# Altium footprint library PCB_Connector.PcbLib: 65 footprints (part 1 of 5)
Each footprint in its own frame and in the unit in brackets; x right, y up, seen from the top. Pads: shape width x height; smd on the part's side, far side on the other; paste and mask are expansions set on the pad; w line width, h text height; cw(c..) or ccw(c..) is an arc to the next point about the centre after c.
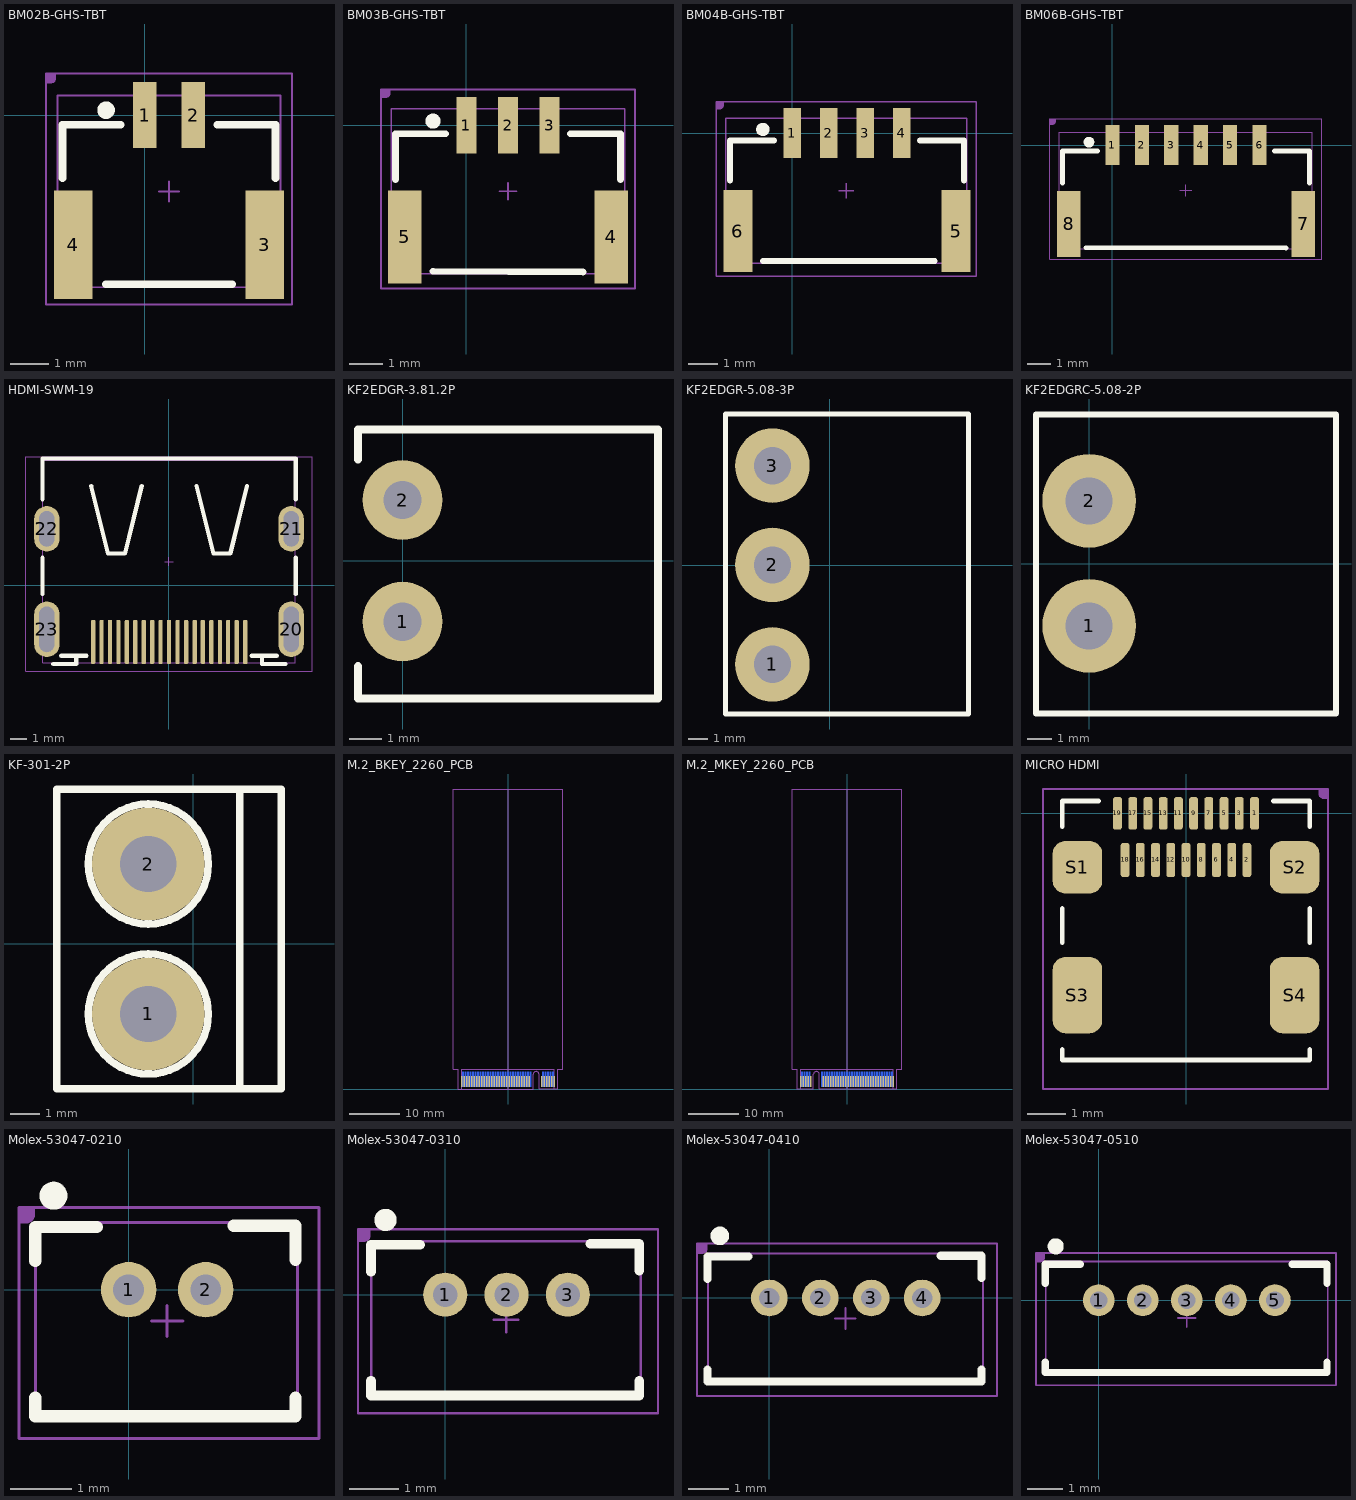
[diagram p0: the footprints below, top view; thin cyan lines are the x and y axes]

## BM02B-GHS-TBT [mm] "GH02立式"
height 4.05
pads (4):
  rect 0.6x1.7 smd: 1(0,0) 2(1.25,0)
  rect 1x2.8 smd: 3(3.1,-3.35) 4(-1.85,-3.35)
Top Overlay:
  circle w0.254: c-1,0.125 r0.1
  lines w0.2: -2.125,-1.625 -2.125,-0.25 -0.625,-0.25 ; -1,-4.375 2.25,-4.375 ; 1.875,-0.25 3.375,-0.25 3.375,-1.625
Top Assembly (Mech13):
  lines w0.051: -2.25,-1.975 -2.25,0.5 ; 0.371,-1.975 0.879,-1.975 ; 0.625,-2.229 0.625,-1.721 ; -2.25,0.5 -2.25,-4.45 3.5,-4.45 3.5,0.5 -2.25,0.5
Top Component:
  region: -2.55,1.073 -2.296,1.073 -2.296,0.946 -2.296,0.921 -2.315,0.874 -2.351,0.838 -2.398,0.819 -2.423,0.819 -2.55,0.819
  lines w0.051: -2.55,-4.896 3.8,-4.896 3.8,1.073 -2.55,1.073 -2.55,-4.896
  text ".Designator" at -0.645,-2.483 h2.03
3D body "BM02B-GHS-TBT.STEP": height 4.18, standoff -0.03, extent -2.25,-4.45 3.5,0.5

## BM03B-GHS-TBT [mm] "GH03立式"
height 4.05
pads (5):
  rect 0.6x1.7 smd: 1(0,0) 2(1.25,0) 3(2.5,0)
  rect 1x2.8 smd: 4(4.35,-3.35) 5(-1.85,-3.35)
Top Overlay:
  circle w0.254: c-1,0.125 r0.1
  lines w0.2: -2.125,-1.625 -2.125,-0.25 -0.625,-0.25 ; -1,-4.375 3.5,-4.4 ; 3.125,-0.25 4.625,-0.25 4.625,-1.625
Top Assembly (Mech13):
  lines w0.051: 0.996,-1.975 1.504,-1.975 ; 1.25,-2.229 1.25,-1.721 ; -2.25,-4.45 4.75,-4.45 4.75,0.5 -2.25,0.5 -2.25,-4.45
Top Component:
  region: -2.54,1.073 -2.286,1.073 -2.286,0.946 -2.286,0.921 -2.305,0.874 -2.341,0.838 -2.388,0.819 -2.413,0.819 -2.54,0.819
  lines w0.051: -2.56,-4.896 -2.56,1.073 5.06,1.073 5.06,-4.896 -2.56,-4.896
  text ".Designator" at -0.02,-2.483 h2.03
3D body "BM03B-GHS-TBT.STEP": height 4.18, standoff -0.03, extent -2.25,-4.45 4.75,0.5

## BM04B-GHS-TBT [mm] "GH04立式"
height 4.05
pads (6):
  rect 0.6x1.7 smd: 1(0,0) 2(1.25,0) 3(2.5,0) 4(3.75,0)
  rect 1x2.8 smd: 5(5.6,-3.35) 6(-1.85,-3.35)
Top Overlay:
  circle w0.254: c-1,0.125 r0.1
  lines w0.2: -2.125,-1.625 -2.125,-0.25 -0.625,-0.25 ; -1,-4.375 4.875,-4.375 ; 4.375,-0.25 5.875,-0.25 5.875,-1.625
Top Assembly (Mech13):
  lines w0.051: 1.596,-1.975 2.104,-1.975 ; 1.85,-2.229 1.85,-1.721 ; -2.275,-4.45 -2.275,0.5 5.975,0.5 5.975,-4.45 -2.275,-4.45
Top Component:
  region: -2.595,1.073 -2.341,1.073 -2.341,0.946 -2.341,0.921 -2.36,0.874 -2.396,0.838 -2.443,0.819 -2.468,0.819 -2.595,0.819
  lines w0.051: -2.595,-4.896 6.295,-4.896 6.295,1.073 -2.595,1.073 -2.595,-4.896
  text ".Designator" at 0.58,-2.483 h2.03
3D body "BM04B-GHS-TBT.STEP": height 4.18, standoff -0.03, extent -2.275,-4.45 5.975,0.5

## BM06B-GHS-TBT [mm] "GH06立式"
height 4.05
pads (8):
  rect 0.6x1.7 smd: 1(0,0) 2(1.25,0) 3(2.5,0) 4(3.75,0) 5(5,0) 6(6.25,0)
  rect 1x2.8 smd: 7(8.1,-3.35) 8(-1.85,-3.35)
Top Overlay:
  circle w0.254: c-1,0.125 r0.1
  lines w0.2: -2.125,-1.625 -2.125,-0.25 -0.625,-0.25 ; -1.132,-4.369 7.375,-4.375 ; 6.875,-0.25 8.375,-0.25 8.375,-1.625
Top Assembly (Mech13):
  lines w0.051: 2.865,-1.93 3.373,-1.93 ; 3.119,-2.184 3.119,-1.676 ; -2.256,-4.405 -2.256,0.545 8.494,0.545 8.494,-4.405 -2.256,-4.405
Top Component:
  region: -2.667,1.118 -2.413,1.118 -2.413,0.991 -2.413,0.965 -2.432,0.919 -2.468,0.883 -2.515,0.864 -2.54,0.864 -2.667,0.864
  lines w0.051: -2.667,-4.851 8.89,-4.851 8.89,1.118 -2.667,1.118 -2.667,-4.851
  text ".Designator" at 1.849,-2.438 h2.03
3D body "BM06B-GHS-TBT.STEP": height 4.18, standoff -0.03, extent -2.256,-4.405 8.494,0.545

## HDMI-SWM-19 [mm] "HDMI-SWM-19"
pads (23):
  rrect50% 0.254x2.6 smd: 1(-4.5,-3.355) 2(-4,-3.355) 3(-3.5,-3.355) 4(-3,-3.355) 5(-2.5,-3.355) 6(-2,-3.355) 7(-1.5,-3.355) 8(-1,-3.355) 9(-0.5,-3.355) 10(0,-3.355) 11(0.508,-3.355) 12(1.016,-3.355) 13(1.524,-3.355) 14(2.007,-3.355) 15(2.515,-3.355) 16(3.023,-3.355) 17(3.505,-3.355) 18(4.013,-3.355) 19(4.521,-3.355)
  oval 1.5x3.3 hole 2.7 slot 0.9 at 0 deg: 20(7.25,-2.605) 23(-7.25,-2.605)
  oval 1.5x2.7 hole 2.1 slot 0.9 at 0 deg: 21(7.25,3.355) 22(-7.25,3.355)
Top Overlay:
  lines w0.254: -7.5,-0.513 -7.5,1.637 ; -7.5,5.116 -7.5,7.529 7.518,7.529 7.518,5.116 ; -6.875,-4.667 -5.5,-4.667 -5.5,-4.167 ; -6.4,-4.167 -5.5,-4.167 ; -4.9,-4.167 -5.5,-4.167 ; -4.619,5.903 -3.619,1.89 -2.619,1.89 -1.619,5.903 ; 1.626,5.903 2.642,1.89 3.632,1.89 4.623,5.903 ; 4.902,-4.167 5.512,-4.167 ; 6.401,-4.167 5.512,-4.167 ; 6.909,-4.667 5.512,-4.667 5.512,-4.167 ; 7.518,-0.513 7.518,1.637
Top Assembly (Mech13):
  lines w0.051: -0.254,1.414 0.254,1.414 ; 0,1.16 0,1.668 ; -7.5,-4.586 7.5,-4.586 7.5,7.414 -7.5,7.414 -7.5,-4.586
Top Component:
  lines w0.051: -8.509,-5.08 -8.509,7.62 8.509,7.62 8.509,-5.08 -8.509,-5.08
  text ".Designator" at -1.274,0.87 h2.03
3D body "1.stp": height 6.14, standoff -2.14, extent -7.5,-4.586 7.5,7.414

## KF2EDGR-3.81.2P [mm]
pads (2):
  round 2.5 hole 1.2: 1(0,-1.905) 2(0,1.905)
Top Overlay:
  lines w0.254: -1.397,-3.302 -1.397,-4.318 8.001,-4.318 8.001,4.119 -1.397,4.119 -1.397,3.175 ; 0,1.143 0,1.524
3D body "KF2EDGR-3.81-2P.stp": height 7.1, standoff -3.17, extent -1.298,-4.191 7.902,4.119

## KF2EDGR-5.08-3P [mil]
pads (3):
  round 150 hole 75: 1(-115,-199) 2(-115,1) 3(-115,201)
Top Overlay:
  lines w10: -210,-299 -210,305 280,305 280,-299 -210,-299
3D body "User Library-MSTB 2,5-3-G-5,08 1759020.STEP": height 338.58, standoff -137.8, extent -195,-300 277.53,300

## KF2EDGRC-5.08-2P [mil]
pads (2):
  round 150 hole 75: 1(0,-99) 2(0,101)
Top Overlay:
  lines w10: -85,-239.37 395,-239.37 395,239.36 -85,239.36 -85,-239.37
3D body "14043.step": height 322.83, standoff -153.54, extent -80,-239.37 392.53,239.37

## KF-301-2P [mil]
pads (2):
  round 150 hole 75: 1(-60,-94) 2(-60,106)
Top Overlay:
  circle w10: c-60,106 r80
  circle w10: c-60,-94 r80
  lines w10: -60,-174 -60,-159 ; -60,-29 -60,-14 ; -60,26 -60,41 ; -60,171 -60,186 ; 62.05,-194 62.05,206 ; -182.05,-194 -182.05,206 117.17,206 117.17,-194 -182.05,-194
3D body "User Library-Terminal-Screw-3A-2way.SLDPRT": height 393.7, standoff -118.11, extent -181.61,-203.84 117.61,213.48

## M.2_BKEY_2260_PCB [mm]
pads (67):
  rect 0.35x2.2 smd: 1(9.25,1.5) 3(8.75,1.5) 5(8.25,1.5) 7(7.75,1.5) 9(7.25,1.5) 11(6.75,1.5) 13(4.25,1.5) 15(3.75,1.5) 17(3.25,1.5) 19(2.75,1.5) 21(2.25,1.5) 23(1.75,1.5) 25(1.25,1.5) 27(0.75,1.5) 29(0.25,1.5) 31(-0.25,1.5) 33(-0.75,1.5) 35(-1.25,1.5) 37(-1.75,1.5) 39(-2.25,1.5) 41(-2.75,1.5) 43(-3.25,1.5) 45(-3.75,1.5) 47(-4.25,1.5) 49(-4.75,1.5) 51(-5.25,1.5) 53(-5.75,1.5) 55(-6.25,1.5) 57(-6.75,1.5) 67(-7.25,1.5) 69(-7.75,1.5) 71(-8.25,1.5) 73(-8.75,1.5) 75(-9.25,1.5)
  rect 0.35x3 smd far side: 2(9,1.9) 4(8.5,1.9) 6(8,1.9) 8(7.5,1.9) 10(7,1.9) 12(4.5,1.9) 14(4,1.9) 16(3.5,1.9) 18(3,1.9) 20(2.5,1.9) 22(2,1.9) 24(1.5,1.9) 26(1,1.9) 28(0.5,1.9) 30(0,1.9) 32(-0.5,1.9) 34(-1,1.9) 36(-1.5,1.9) 38(-2,1.9) 40(-2.5,1.9) 42(-3,1.9) 44(-3.5,1.9) 46(-4,1.9) 48(-4.5,1.9) 50(-5,1.9) 52(-5.5,1.9) 54(-6,1.9) 56(-6.5,1.9) 58(-7,1.9) 68(-7.5,1.9) 70(-8,1.9) 72(-8.5,1.9) 74(-9,1.9)
Top Component:
  lines w0.051: -9.25,0 -9.25,4 9.25,4 9.25,0 ; 0,0 0,60 ; -11,4 -11,60 11,60 11,4 9.925,4 9.925,0 6.225,0 6.225,2.9 ccw(c5.625,2.9) 5.625,3.5 ccw(c5.625,2.9) 5.025,2.9 5.025,0 -9.925,0 -9.925,4 -11,4

## M.2_MKEY_2260_PCB [mm]
pads (67):
  rect 0.35x2.2 smd: 1(9.25,1.5) 3(8.75,1.5) 5(8.25,1.5) 7(7.75,1.5) 9(7.25,1.5) 11(6.75,1.5) 13(6.25,1.5) 15(5.75,1.5) 17(5.25,1.5) 19(4.75,1.5) 21(4.25,1.5) 23(3.75,1.5) 25(3.25,1.5) 27(2.75,1.5) 29(2.25,1.5) 31(1.75,1.5) 33(1.25,1.5) 35(0.75,1.5) 37(0.25,1.5) 39(-0.25,1.5) 41(-0.75,1.5) 43(-1.25,1.5) 45(-1.75,1.5) 47(-2.25,1.5) 49(-2.75,1.5) 51(-3.25,1.5) 53(-3.75,1.5) 55(-4.25,1.5) 57(-4.75,1.5) 67(-7.25,1.5) 69(-7.75,1.5) 71(-8.25,1.5) 73(-8.75,1.5) 75(-9.25,1.5)
  rect 0.35x3 smd far side: 2(9,1.9) 4(8.5,1.9) 6(8,1.9) 8(7.5,1.9) 10(7,1.9) 12(6.5,1.9) 14(6,1.9) 16(5.5,1.9) 18(5,1.9) 20(4.5,1.9) 22(4,1.9) 24(3.5,1.9) 26(3,1.9) 28(2.5,1.9) 30(2,1.9) 32(1.5,1.9) 34(1,1.9) 36(0.5,1.9) 38(0,1.9) 40(-0.5,1.9) 42(-1,1.9) 44(-1.5,1.9) 46(-2,1.9) 48(-2.5,1.9) 50(-3,1.9) 52(-3.5,1.9) 54(-4,1.9) 56(-4.5,1.9) 58(-5,1.9) 68(-7.5,1.9) 70(-8,1.9) 72(-8.5,1.9) 74(-9,1.9)
Top Component:
  lines w0.051: -9.25,0 -9.25,4 9.25,4 9.25,0 ; 0,0 0,60 ; -11,4 -11,60 11,60 11,4 9.925,4 9.925,0 -5.525,0 -5.525,2.9 ccw(c-6.125,2.9) -6.125,3.5 ccw(c-6.125,2.9) -6.725,2.9 -6.725,0 -9.925,0 -9.925,4 -11,4

## MICRO HDMI [mm]
height 0.8
pads (23):
  rrect50% 0.23x0.85 smd: 1(1.8,0) 3(1.4,0) 5(1,0) 7(0.6,0) 9(0.2,0) 11(-0.2,0) 13(-0.6,0) 15(-1,0) 17(-1.4,0) 19(-1.8,0)
  rrect50% 0.23x0.889 smd: 2(1.6,-1.225) 4(1.2,-1.225) 6(0.8,-1.225) 8(0.4,-1.225) 10(0,-1.225) 12(-0.4,-1.225) 14(-0.8,-1.225) 16(-1.2,-1.225) 18(-1.6,-1.225)
  rrect50% 1.3x1.38 smd: S1(-2.85,-1.415) S2(2.85,-1.415)
  rrect50% 1.3x2 smd: S3(-2.85,-4.775) S4(2.85,-4.775)
Top Overlay:
  lines w0.127: -3.25,-6.2 -3.25,-6.475 3.25,-6.475 3.25,-6.2 ; -3.25,-3.4 -3.25,-2.5 ; -3.25,-0.35 -3.25,0.325 -2.3,0.325 ; 2.3,0.325 3.25,0.325 3.25,-0.35 ; 3.25,-3.4 3.25,-2.5
Top Component:
  region: 3.734,0.64 3.734,0.386 3.607,0.386 3.582,0.386 3.535,0.405 3.499,0.441 3.48,0.487 3.48,0.513 3.48,0.64
  lines w0.051: -3.759,-7.239 -3.759,0.64 3.734,0.64 3.734,-7.239 -3.759,-7.239
  text ".Designator" at -1.067,-3.556 h2.03
3D body "User Library-MicroHDMI.STEP": height 2.98, standoff 0.01, extent -3.25,-7.15 3.25,0.35

## Molex-53047-0210 [mm] "立式1.25mm Pitch PicoBlade Header"
height 3.4
pads (2):
  round 0.9 hole 0.5: 1(0,0) 2(1.25,0)
Top Overlay:
  circle w0.254: c-1.218,1.524 r0.1
  lines w0.2: -1.516,-1.755 -1.516,-2.055 2.707,-2.055 2.707,-1.755 ; -1.516,0.466 -1.516,1.016 -0.516,1.016 ; 1.707,1.037 2.707,1.037 2.707,0.487
Top Assembly (Mech13):
  lines w0.051: 0.371,-0.508 0.879,-0.508 ; 0.625,-0.762 0.625,-0.254 ; -1.51,-2.108 2.74,-2.108 2.74,1.092 -1.51,1.092 -1.51,-2.108
Top Component:
  region: -1.778,1.333 -1.524,1.333 -1.524,1.206 -1.524,1.181 -1.543,1.135 -1.579,1.099 -1.626,1.079 -1.651,1.079 -1.778,1.079
  lines w0.051: -1.778,-2.413 -1.778,1.333 3.088,1.333 3.088,-2.413 -1.778,-2.413
  text ".Designator" at 1.016,-0.762 h2.03
3D body "530470210.stp": height 4.18, standoff -2.32, extent -1.51,-2.108 2.74,1.092

## Molex-53047-0310 [mm] "立式1.25mm Pitch PicoBlade Header"
height 3.4
pads (3):
  round 0.9 hole 0.5: 1(0,0) 2(1.25,0) 3(2.5,0)
Top Overlay:
  circle w0.254: c-1.218,1.524 r0.1
  lines w0.2: -1.516,-1.755 -1.516,-2.055 3.957,-2.055 3.957,-1.755 ; -1.516,0.466 -1.516,1.016 -0.516,1.016 ; 2.957,1.037 3.957,1.037 3.957,0.487
Top Assembly (Mech13):
  lines w0.051: 0.986,-0.508 1.494,-0.508 ; 1.24,-0.762 1.24,-0.254 ; -1.51,-2.108 3.99,-2.108 3.99,1.092 -1.51,1.092 -1.51,-2.108
Top Component:
  region: -1.778,1.333 -1.524,1.333 -1.524,1.206 -1.524,1.181 -1.543,1.135 -1.579,1.099 -1.626,1.079 -1.651,1.079 -1.778,1.079
  lines w0.051: -1.778,-2.413 -1.778,1.333 4.338,1.333 4.338,-2.413 -1.778,-2.413
  text ".Designator" at 1.016,-0.762 h2.03
3D body "530470310.stp": height 4.18, standoff -2.32, extent -1.52,-2.108 3.98,1.092

## Molex-53047-0410 [mm] "立式1.25mm Pitch PicoBlade Header"
height 3.4
pads (4):
  round 0.9 hole 0.5: 1(0,0) 2(1.25,0) 3(2.5,0) 4(3.75,0)
Top Overlay:
  circle w0.254: c-1.218,1.524 r0.1
  lines w0.2: -1.516,-1.755 -1.516,-2.055 5.207,-2.055 5.207,-1.755 ; -1.516,0.466 -1.516,1.016 -0.516,1.016 ; 4.207,1.037 5.207,1.037 5.207,0.487
Top Assembly (Mech13):
  lines w0.051: 1.611,-0.508 2.119,-0.508 ; 1.865,-0.762 1.865,-0.254 ; -1.51,-2.108 -1.51,1.092 5.24,1.092 5.24,-2.108 -1.51,-2.108
Top Component:
  region: -1.778,1.333 -1.524,1.333 -1.524,1.206 -1.524,1.181 -1.543,1.135 -1.579,1.099 -1.626,1.079 -1.651,1.079 -1.778,1.079
  lines w0.051: -1.778,-2.413 5.588,-2.413 5.588,1.333 -1.778,1.333 -1.778,-2.413
  text ".Designator" at 1.016,-0.762 h2.03
3D body "530470410.stp": height 4.18, standoff -2.32, extent -1.51,-2.108 5.24,1.092

## Molex-53047-0510 [mm] "立式1.25mm Pitch PicoBlade Header"
height 3.4
pads (5):
  round 0.9 hole 0.5: 1(0,0) 2(1.25,0) 3(2.5,0) 4(3.75,0) 5(5,0)
Top Overlay:
  circle w0.254: c-1.218,1.524 r0.1
  lines w0.2: -1.516,-1.755 -1.516,-2.055 5.334,-2.055 6.477,-2.055 6.477,-1.755 ; -1.516,0.466 -1.516,1.016 -0.516,1.016 ; 5.477,1.016 6.477,1.016 6.477,0.466
Top Assembly (Mech13):
  lines w0.051: 2.246,-0.508 2.754,-0.508 ; 2.5,-0.762 2.5,-0.254 ; -1.5,-2.108 6.5,-2.108 6.5,1.092 -1.5,1.092 -1.5,-2.108
Top Component:
  region: -1.778,1.333 -1.524,1.333 -1.524,1.206 -1.524,1.181 -1.543,1.135 -1.579,1.099 -1.626,1.079 -1.651,1.079 -1.778,1.079
  lines w0.051: -1.778,-2.413 -1.778,1.333 6.731,1.333 6.731,-2.413 -1.778,-2.413
  text ".Designator" at 1.651,-0.762 h2.03
3D body "530470510.stp": height 4.18, standoff -2.32, extent -1.5,-2.108 6.5,1.092